# Altium footprint library hphonglib.PcbLib: 1250 footprints (part 13 of 79)
Each footprint in its own frame and in the unit in brackets; x right, y up, seen from the top. Pads: shape width x height; smd on the part's side, far side on the other; paste and mask are expansions set on the pad; w line width, h text height; cw(c..) or ccw(c..) is an arc to the next point about the centre after c.
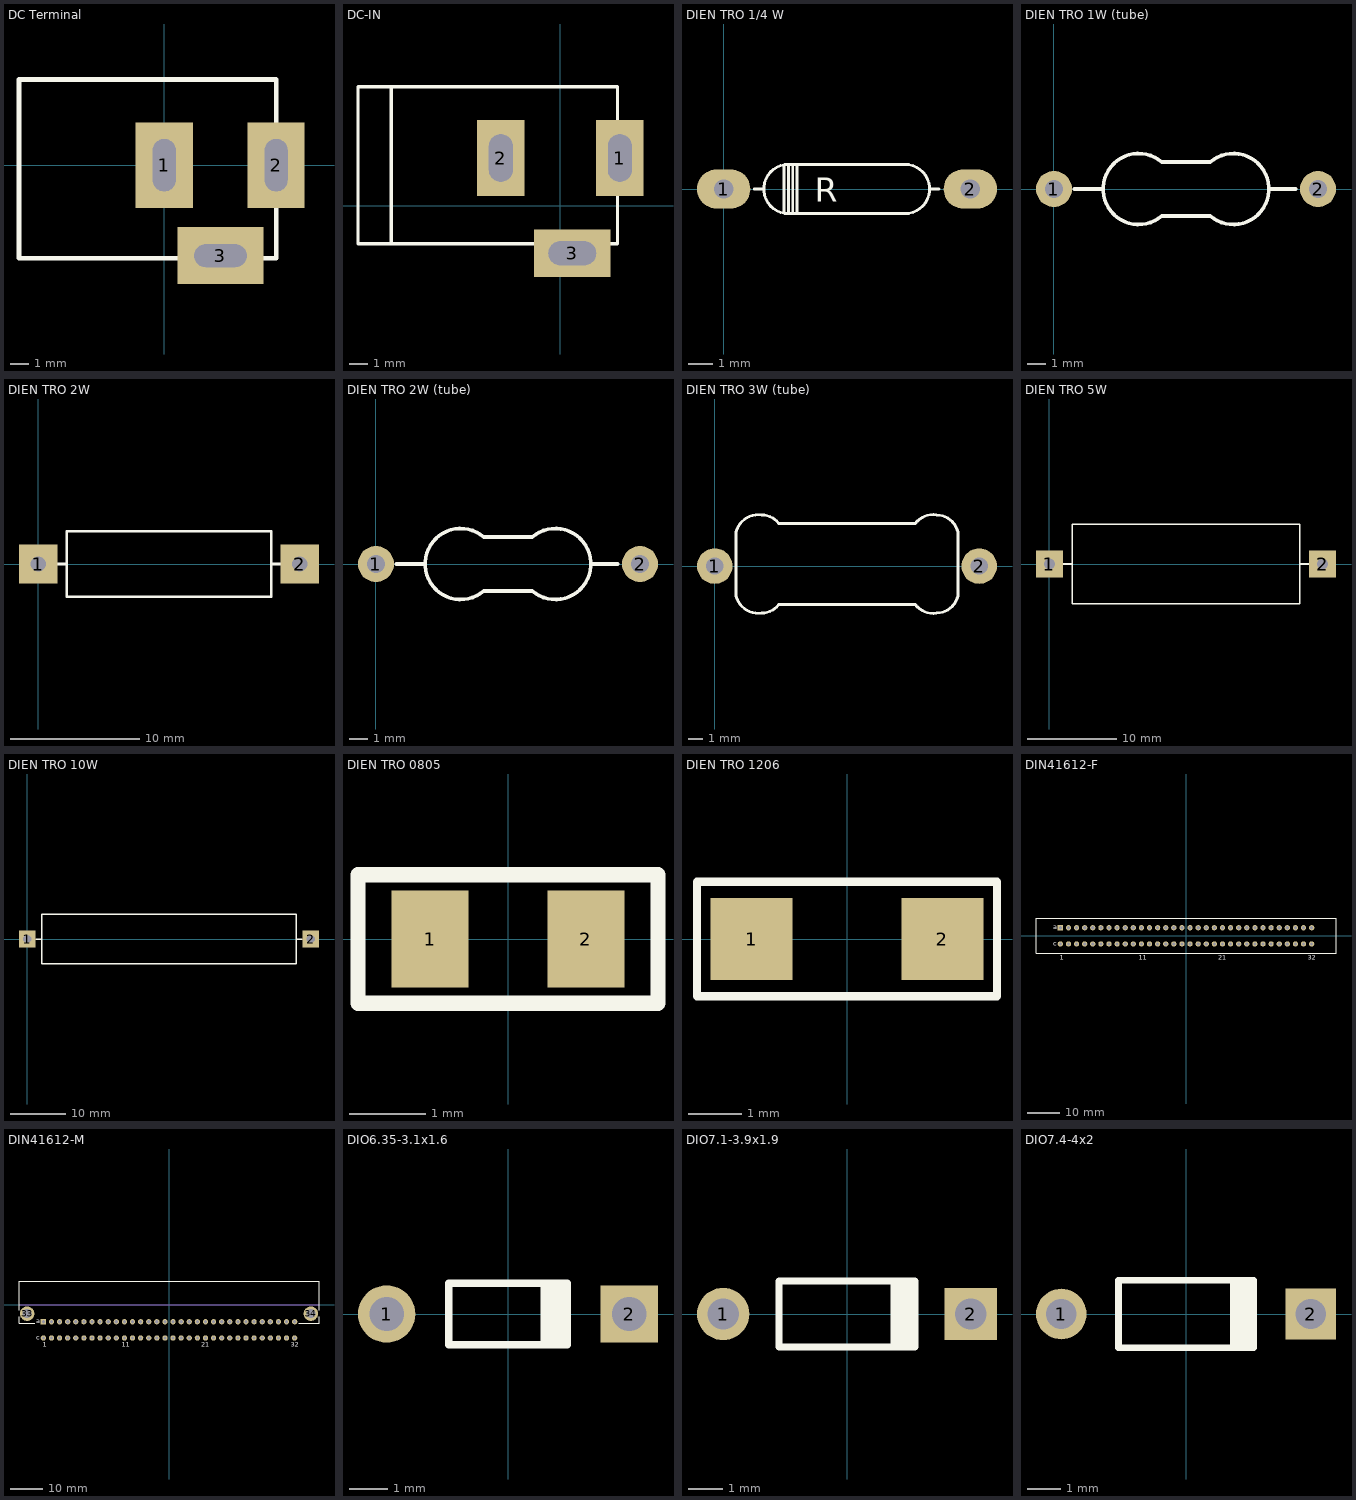
[diagram p12: the footprints below, top view; thin cyan lines are the x and y axes]

## DC Terminal [mil] "DC Terminal; Solder Pad 30mil"
pads (3):
  rect 120x180 hole 48 slot 110 at 90 deg: 1(0,0) 2(235,0)
  rect 180x120 hole 48 slot 110 at 0 deg: 3(118,-190)
Top Overlay:
  lines w10: -305,-195.2 235,-195.2 235,180 -305,180 -305,-195.2
3D body "User Library-DC_JACK.STEP": height 433.07, standoff -157.48, extent -305.43,-208.66 265.43,177.16

## DC-IN [mil] "Jac DC input"
height 200
pads (3):
  rect 100x160 hole 50 slot 100 at 90 deg: 1(125,100) 2(-125,100)
  rect 160x100 hole 50 slot 100 at 0 deg: 3(25,-100)
Top Overlay:
  lines w7: -355,-80 -355,250 ; -425,-80 120,-80 120,250 -425,250 -425,-80
3D body "SW3dPS-dc range - dc connector[4840.2201].STEP": height 433.67, standoff -137.2, extent -410.35,-105.12 134,269.12

## DIEN TRO 1/4 W [mm]
pads (2):
  oval 2.2x1.6 hole 0.787: 1(0,0) 2(10.16,0)
Top Overlay:
  lines w0.12: 1.257,0 1.651,0 ; 2.489,-0.978 2.489,0.978 ; 2.591,1.016 7.468,1.016 cw(c7.468,0) 7.468,-1.016 2.667,-1.016 cw(c2.667,0) 2.667,1.016 ; 2.68,-1.016 2.667,-1.003 2.667,1.003 2.68,1.016 ; 2.845,-1.016 2.845,1.016 ; 3.023,-1.003 3.023,0.991 ; 8.484,0 8.877,0
  text "R" at 3.746,-0.521 h1
3D body "User Library-RESISTOR, 0_25 W, 0_4 IN LEAD PITCH.step": height 2.93, standoff -2.54, extent -0.305,-1.156 10.465,1.156

## DIEN TRO 1W (tube) [mm] "Dien tro 1W hinh ong"
pads (2):
  round 2 hole 1: 1(0,0) 2(14.707,0)
Top Overlay:
  lines w0.2: 1.143,0 2.701,0 ; 12.006,0 13.462,0
  lines w0.203: 6.003,-1.501 cw(c4.716,0) 6.003,1.501 8.704,1.501 cw(c9.99,0) 8.704,-1.501 6.003,-1.501

## DIEN TRO 2W [mm]
pads (2):
  rect 3x3 hole 1.2: 1(0,0) 2(20.32,0)
Top Overlay:
  lines w0.203: 2.222,-2.54 2.222,2.54 ; 2.222,-2.54 18.098,-2.54 ; 2.222,-2.54 2.222,2.54 ; 2.222,-2.54 18.098,-2.54 ; 2.222,2.54 18.098,2.54 ; 2.222,2.54 18.098,2.54 ; 18.098,-2.54 18.098,2.54 ; 18.098,-2.54 18.098,2.54 ; 1.27,0 2.222,0 1.27,0 ; 18.098,0 19.05,0 18.098,0
3D body: height 5.08, standoff 0, extent 2.222,-2.54 18.098,2.54

## DIEN TRO 2W (tube) [mm] "Dien tro 2W hinh ong"
pads (2):
  round 2 hole 1: 1(0,0) 2(14.707,0)
Top Overlay:
  lines w0.2: 1.143,0 2.701,0 ; 12.006,0 13.462,0
  lines w0.203: 6.003,-1.501 cw(c4.716,0) 6.003,1.501 8.704,1.501 cw(c9.99,0) 8.704,-1.501 6.003,-1.501

## DIEN TRO 3W (tube) [mm] "Dien tro 3W dang ong tru"
pads (2):
  round 2.5 hole 1.2: 1(0,0) 2(18.609,0)
Top Overlay:
  lines w0.2: 3.302,-3.302 cw(c3.062,-1.711) 1.501,-2.101 1.501,2.401 cw(c3.062,2.011) 3.302,3.602 cw(c3.302,2.101) 4.502,3.002 14.107,3.001 cw(c15.357,2.051) 15.607,3.602 cw(c15.586,2.037) 17.108,2.401 17.108,-2.101 cw(c15.586,-1.737) 15.607,-3.302 cw(c15.357,-1.751) 14.107,-2.701 4.502,-2.701 cw(c3.302,-1.801) 3.302,-3.301

## DIEN TRO 5W [mm]
pads (2):
  rect 3x3 hole 1.2: 1(0,0) 2(30.48,0)
Top Overlay:
  lines w0.203: 2.54,-4.445 2.54,4.445 ; 2.54,-4.445 27.94,-4.445 ; 2.54,-4.445 2.54,4.445 ; 2.54,-4.445 27.94,-4.445 ; 2.54,4.445 27.94,4.445 ; 2.54,4.445 27.94,4.445 ; 27.94,-4.445 27.94,4.445 ; 27.94,-4.445 27.94,4.445 ; 1.27,0 2.54,0 1.27,0 ; 27.94,0 29.21,0 27.94,0
3D body: height 7.62, standoff 0, extent 2.54,-4.445 27.94,4.445

## DIEN TRO 10W [mm]
pads (2):
  rect 3x3 hole 1.5: 1(0,0) 2(50.8,0)
Top Overlay:
  lines w0.254: 1.524,0 2.54,0 ; 48.26,0 49.276,0 ; 2.54,-4.445 48.26,-4.445 48.26,4.445 2.54,4.445 2.54,-4.445
3D body: height 7.62, standoff 0, extent 2.54,-4.445 48.26,4.445

## DIEN TRO 0805 [mm] "Chip Resistor; Body 2.0 x 1.3 mm (LxW typ)"
height 2.54
pads (2):
  rect 1x1.27 smd: 1(-1.016,0) 2(1.016,0)
Top Overlay:
  lines w0.2: 1.956,0.813 1.956,-0.838 -1.956,-0.838 -1.956,0.838 1.956,0.838
3D body "User Library-0805 SMD Resistor.step": height 0.78, standoff 0, extent -1,-0.625 1,0.625

## DIEN TRO 1206 [mil]
pads (2):
  rect 60x60 smd: 1(-70,0) 2(70,0)
Top Overlay:
  lines w6: -110,-42 110,-42 110,0 110,42 -110,42 -110,0 -110,-42

## DIN41612-F [mm] "Connector; DIN 41612, Type C, Thru-Hole; Rows a+c, 64 Position; Vertical; No Mounting Fixture"
height 13
pads (64):
  rect 1.65x1.65 hole 1: A1(-39.37,2.54)
  round 1.65 hole 1: A2(-36.83,2.54) A3(-34.29,2.54) A4(-31.75,2.54) A5(-29.21,2.54) A6(-26.67,2.54) A7(-24.13,2.54) A8(-21.59,2.54) A9(-19.05,2.54) A10(-16.51,2.54) A11(-13.97,2.54) A12(-11.43,2.54) A13(-8.89,2.54) A14(-6.35,2.54) A15(-3.81,2.54) A16(-1.27,2.54) A17(1.27,2.54) A18(3.81,2.54) A19(6.35,2.54) A20(8.89,2.54) A21(11.43,2.54) A22(13.97,2.54) A23(16.51,2.54) A24(19.05,2.54) A25(21.59,2.54) A26(24.13,2.54) A27(26.67,2.54) A28(29.21,2.54) A29(31.75,2.54) A30(34.29,2.54) A31(36.83,2.54) A32(39.37,2.54) C1(-39.37,-2.54) C2(-36.83,-2.54) C3(-34.29,-2.54) C4(-31.75,-2.54) C5(-29.21,-2.54) C6(-26.67,-2.54) C7(-24.13,-2.54) C8(-21.59,-2.54) C9(-19.05,-2.54) C10(-16.51,-2.54) C11(-13.97,-2.54) C12(-11.43,-2.54) C13(-8.89,-2.54) C14(-6.35,-2.54) C15(-3.81,-2.54) C16(-1.27,-2.54) C17(1.27,-2.54) C18(3.81,-2.54) C19(6.35,-2.54) C20(8.89,-2.54) C21(11.43,-2.54) C22(13.97,-2.54) C23(16.51,-2.54) C24(19.05,-2.54) C25(21.59,-2.54) C26(24.13,-2.54) C27(26.67,-2.54) C28(29.21,-2.54) C29(31.75,-2.54) C30(34.29,-2.54) C31(36.83,-2.54) C32(39.37,-2.54)
Top Overlay:
  lines w0.2: -47,-5.5 -47,5.5 47,5.5 47,-5.5 -47,-5.5
  text "21" at 10.18,-7.5 h1.5
  text "11" at -14.82,-7.5 h1.5
  text "32" at 38.12,-7.5 h1.5
  text "c" at -41.58,-3.04 h1.5
  text "a" at -41.58,2.04 h1.5
  text "1" at -39.62,-7.5 h1.5

## DIN41612-M [mm] "Connector; DIN 41612, Type C, Thru-Hole; Rows a+c, 64 Position; Right Angle"
height 11.1
pads (66):
  round 4.6 hole 2.8: 33(-44.45,-2.76) 34(44.45,-2.76)
  rect 1.65x1.65 hole 1: A1(-39.37,-5.3)
  round 1.65 hole 1: A2(-36.83,-5.3) A3(-34.29,-5.3) A4(-31.75,-5.3) A5(-29.21,-5.3) A6(-26.67,-5.3) A7(-24.13,-5.3) A8(-21.59,-5.3) A9(-19.05,-5.3) A10(-16.51,-5.3) A11(-13.97,-5.3) A12(-11.43,-5.3) A13(-8.89,-5.3) A14(-6.35,-5.3) A15(-3.81,-5.3) A16(-1.27,-5.3) A17(1.27,-5.3) A18(3.81,-5.3) A19(6.35,-5.3) A20(8.89,-5.3) A21(11.43,-5.3) A22(13.97,-5.3) A23(16.51,-5.3) A24(19.05,-5.3) A25(21.59,-5.3) A26(24.13,-5.3) A27(26.67,-5.3) A28(29.21,-5.3) A29(31.75,-5.3) A30(34.29,-5.3) A31(36.83,-5.3) A32(39.37,-5.3) C1(-39.37,-10.38) C2(-36.83,-10.38) C3(-34.29,-10.38) C4(-31.75,-10.38) C5(-29.21,-10.38) C6(-26.67,-10.38) C7(-24.13,-10.38) C8(-21.59,-10.38) C9(-19.05,-10.38) C10(-16.51,-10.38) C11(-13.97,-10.38) C12(-11.43,-10.38) C13(-8.89,-10.38) C14(-6.35,-10.38) C15(-3.81,-10.38) C16(-1.27,-10.38) C17(1.27,-10.38) C18(3.81,-10.38) C19(6.35,-10.38) C20(8.89,-10.38) C21(11.43,-10.38) C22(13.97,-10.38) C23(16.51,-10.38) C24(19.05,-10.38) C25(21.59,-10.38) C26(24.13,-10.38) C27(26.67,-10.38) C28(29.21,-10.38) C29(31.75,-10.38) C30(34.29,-10.38) C31(36.83,-10.38) C32(39.37,-10.38)
Top Overlay:
  lines w0.2: -47,-3.76 -47,-5.8 -42.07,-5.8 ; -47,-1.76 -47,7.34 47,7.34 47,-1.76 ; 40.595,-5.8 47,-5.8 47,-3.76
  text "21" at 10.18,-13.08 h1.5
  text "11" at -14.845,-13.08 h1.5
  text "32" at 38.12,-13.08 h1.5
  text "c" at -41.58,-10.88 h1.5
  text "a" at -41.58,-5.8 h1.5
  text "1" at -39.62,-13.08 h1.5
Mechanical 1:
  lines w0.1: -47,0 47,0
  text "PCB Edge" at -46.47,0.5 h0.6

## DIO6.35-3.1x1.6 [mm] "Diode, Axial; Body 3 x 1.6 mm (LxDia. max), Lead Dia. 0.55 mm (max)"
height 1.6
pads (2):
  round 1.5 hole 0.9: 1(-3.175,0)
  rect 1.5x1.5 hole 0.9: 2(3.175,0)
Top Overlay:
  rectangle: 0.85,-0.8 1.65,0.8
  lines w0.2: 1.55,-0.8 -1.55,-0.8 -1.55,0.8 1.55,0.8

## DIO7.1-3.9x1.9 [mm] "Diode, Axial; Body 3.8 x 1.9 mm (LxDia. max), Lead Dia. 0.53 mm (max)"
height 1.9
pads (2):
  round 1.5 hole 0.9: 1(-3.55,0)
  rect 1.5x1.5 hole 0.9: 2(3.55,0)
Top Overlay:
  rectangle: 1.25,-0.95 2.05,0.95
  lines w0.2: 1.95,-0.95 -1.95,-0.95 -1.95,0.95 1.95,0.95

## DIO7.4-4x2 [mm] "Diode, Axial; Body 4 x 2 mm (LxDia. max), Lead Dia. 0.6 mm (max)"
height 2
pads (2):
  round 1.5 hole 0.9: 1(-3.7,0)
  rect 1.5x1.5 hole 0.9: 2(3.7,0)
Top Overlay:
  rectangle: 1.3,-1 2.1,1
  lines w0.2: 2,-1 -2,-1 -2,1 2,1